# Altium schematic symbol library relay.SCHLIB: 425 symbols (part 2 of 3)
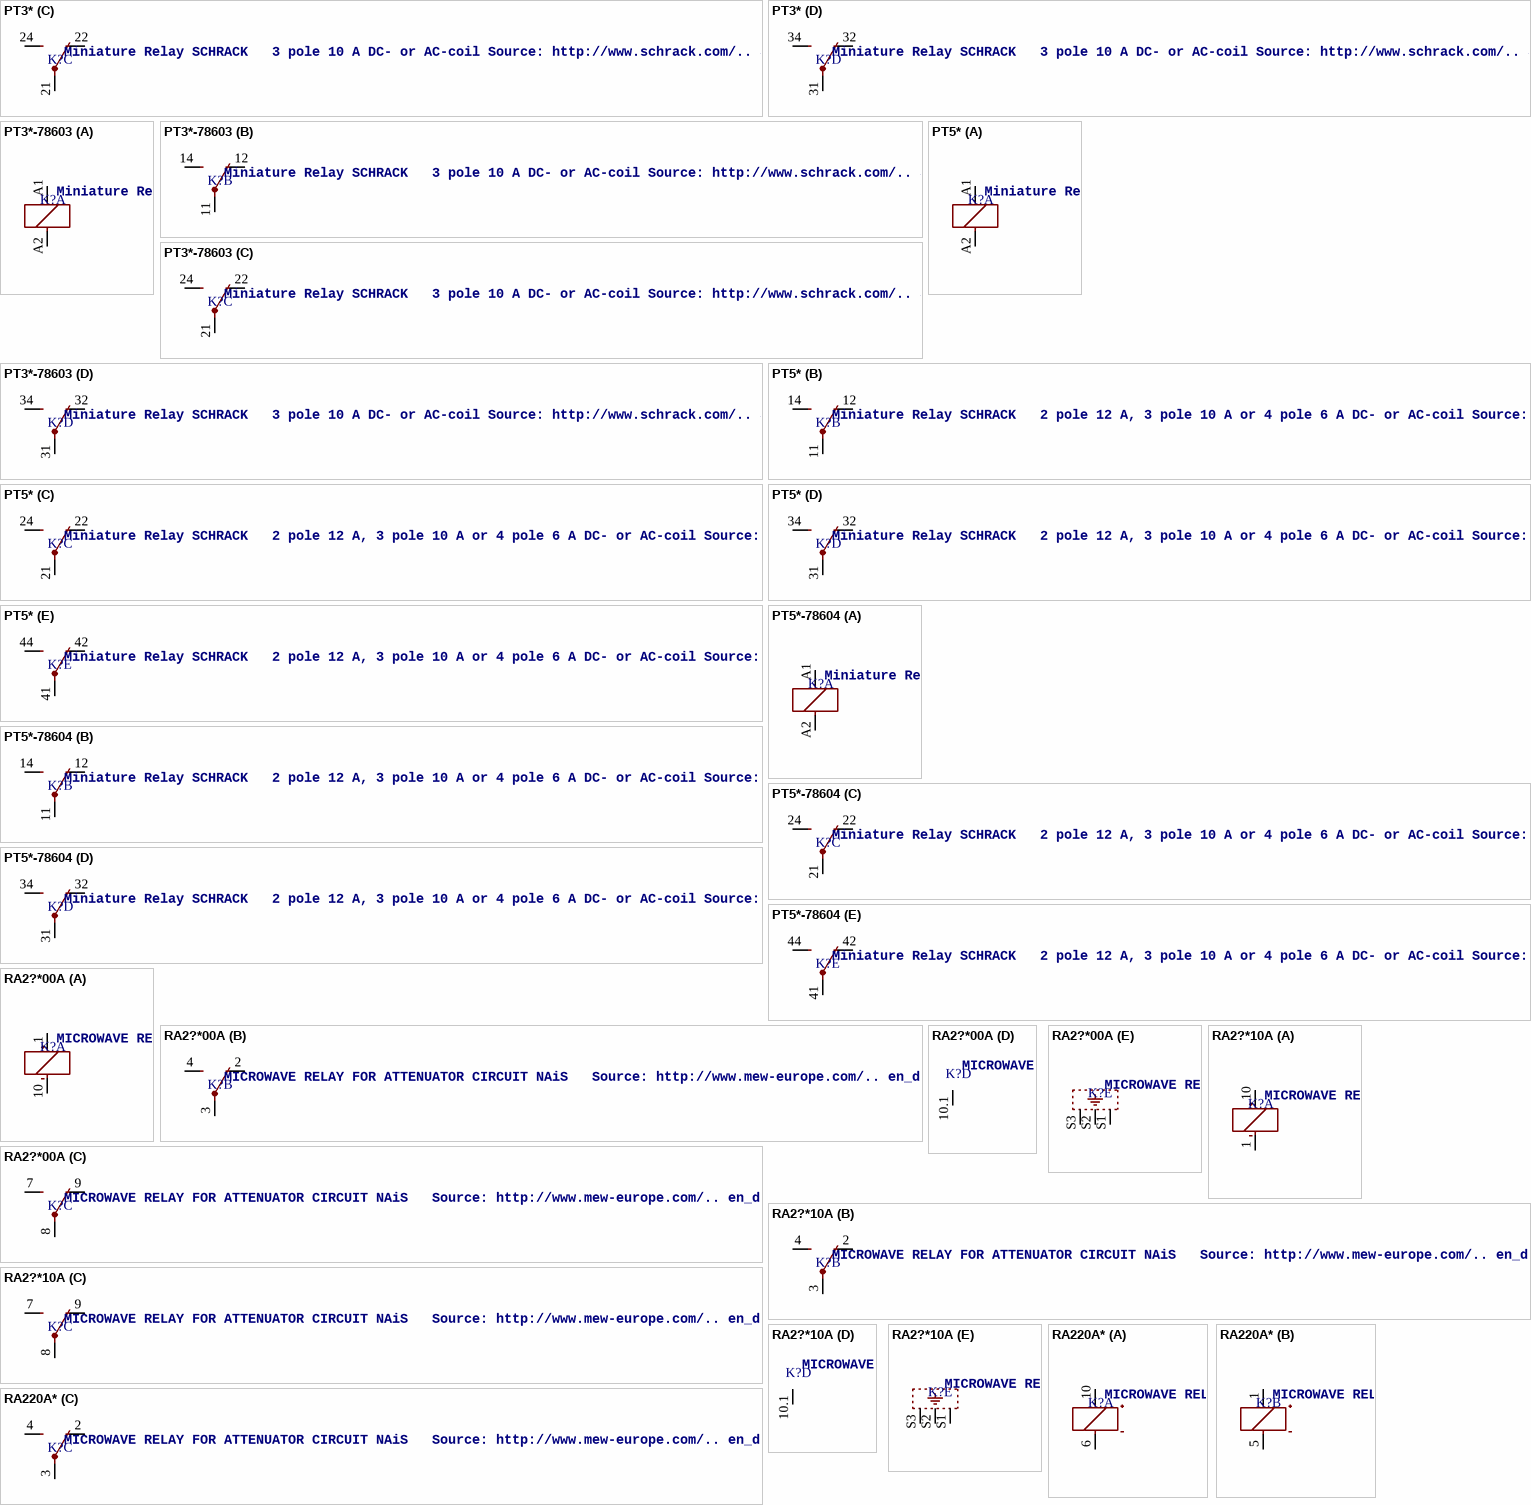
[diagram p39: symbols PT3* to RA220A*]

## PT5*
designator K?, comment Miniature Relay SCHRACK   2 pole 12 A, 3 pole 10 A or 4 pole 6 A DC- or AC-coil Source: http://www.schrack.com/.. 5823.pdf Socked 78604 Source: http://www.schrack.com/.. 5836.pdf
MPN: PT571524; MPN: PT571615; MPN: PT571730; MF: FARNELL; OC_FARNELL: unknown; OC_NEWARK: unknown; OC_FARNELL: 3072836; OC_NEWARK: 08J0830; OC_FARNELL: 3072990; OC_NEWARK: 85H0667; OC_FARNELL: 3073014; OC_NEWARK: 18J8266
footprint PT-4
part A pins: A1 1, A2 2
part B pins: 11 P, 12 O, 14 S
part C pins: 21 P, 22 O, 24 S
part D pins: 31 P, 32 O, 34 S
part E pins: 41 P, 42 O, 44 S

## PT5*-78604
designator K?, comment Miniature Relay SCHRACK   2 pole 12 A, 3 pole 10 A or 4 pole 6 A DC- or AC-coil Source: http://www.schrack.com/.. 5823.pdf Socked 78604 Source: http://www.schrack.com/.. 5836.pdf
OC_FARNELL: unknown; OC_NEWARK: unknown
footprint PT78604
part A pins: A1 1, A2 2
part B pins: 11 P, 12 O, 14 S
part C pins: 21 P, 22 O, 24 S
part D pins: 31 P, 32 O, 34 S
part E pins: 41 P, 42 O, 44 S

## RA2?*00A
designator K?, comment MICROWAVE RELAY FOR ATTENUATOR CIRCUIT NAiS   Source: http://www.mew-europe.com/.. en_ds_61308_0000.pdf
MPN: ARA200A03; OC_FARNELL: unknown; OC_NEWARK: 13P1235; OC_NEWARK: unknown
footprint RA
part A pins: 1 +, 10 -
part B pins: 2 O, 3 P, 4 S
part C pins: 7 S, 8 P, 9 O
part D pins: 10.1 -
part E pins: S1 SH@3, S2 SH@2, S3 SH@1

## RA2?*10A
designator K?, comment MICROWAVE RELAY FOR ATTENUATOR CIRCUIT NAiS   Source: http://www.mew-europe.com/.. en_ds_61308_0000.pdf
MPN: ARA210A05; MPN: ARA210A06; MPN: ARA210A12; MPN: ARA210A4H; MF: AROMAT/ MATSUSHITA; OC_FARNELL: unknown; OC_NEWARK: unknown; OC_NEWARK: 10C4091; OC_NEWARK: 10C4092; OC_NEWARK: 64K3073; OC_NEWARK: 64K3074
footprint RA-1COIL
part A pins: 1 -, 10 +
part B pins: 2 O, 3 P, 4 S
part C pins: 7 S, 8 P, 9 O
part D pins: 10.1 -
part E pins: S1 SH@3, S2 SH@2, S3 SH@1

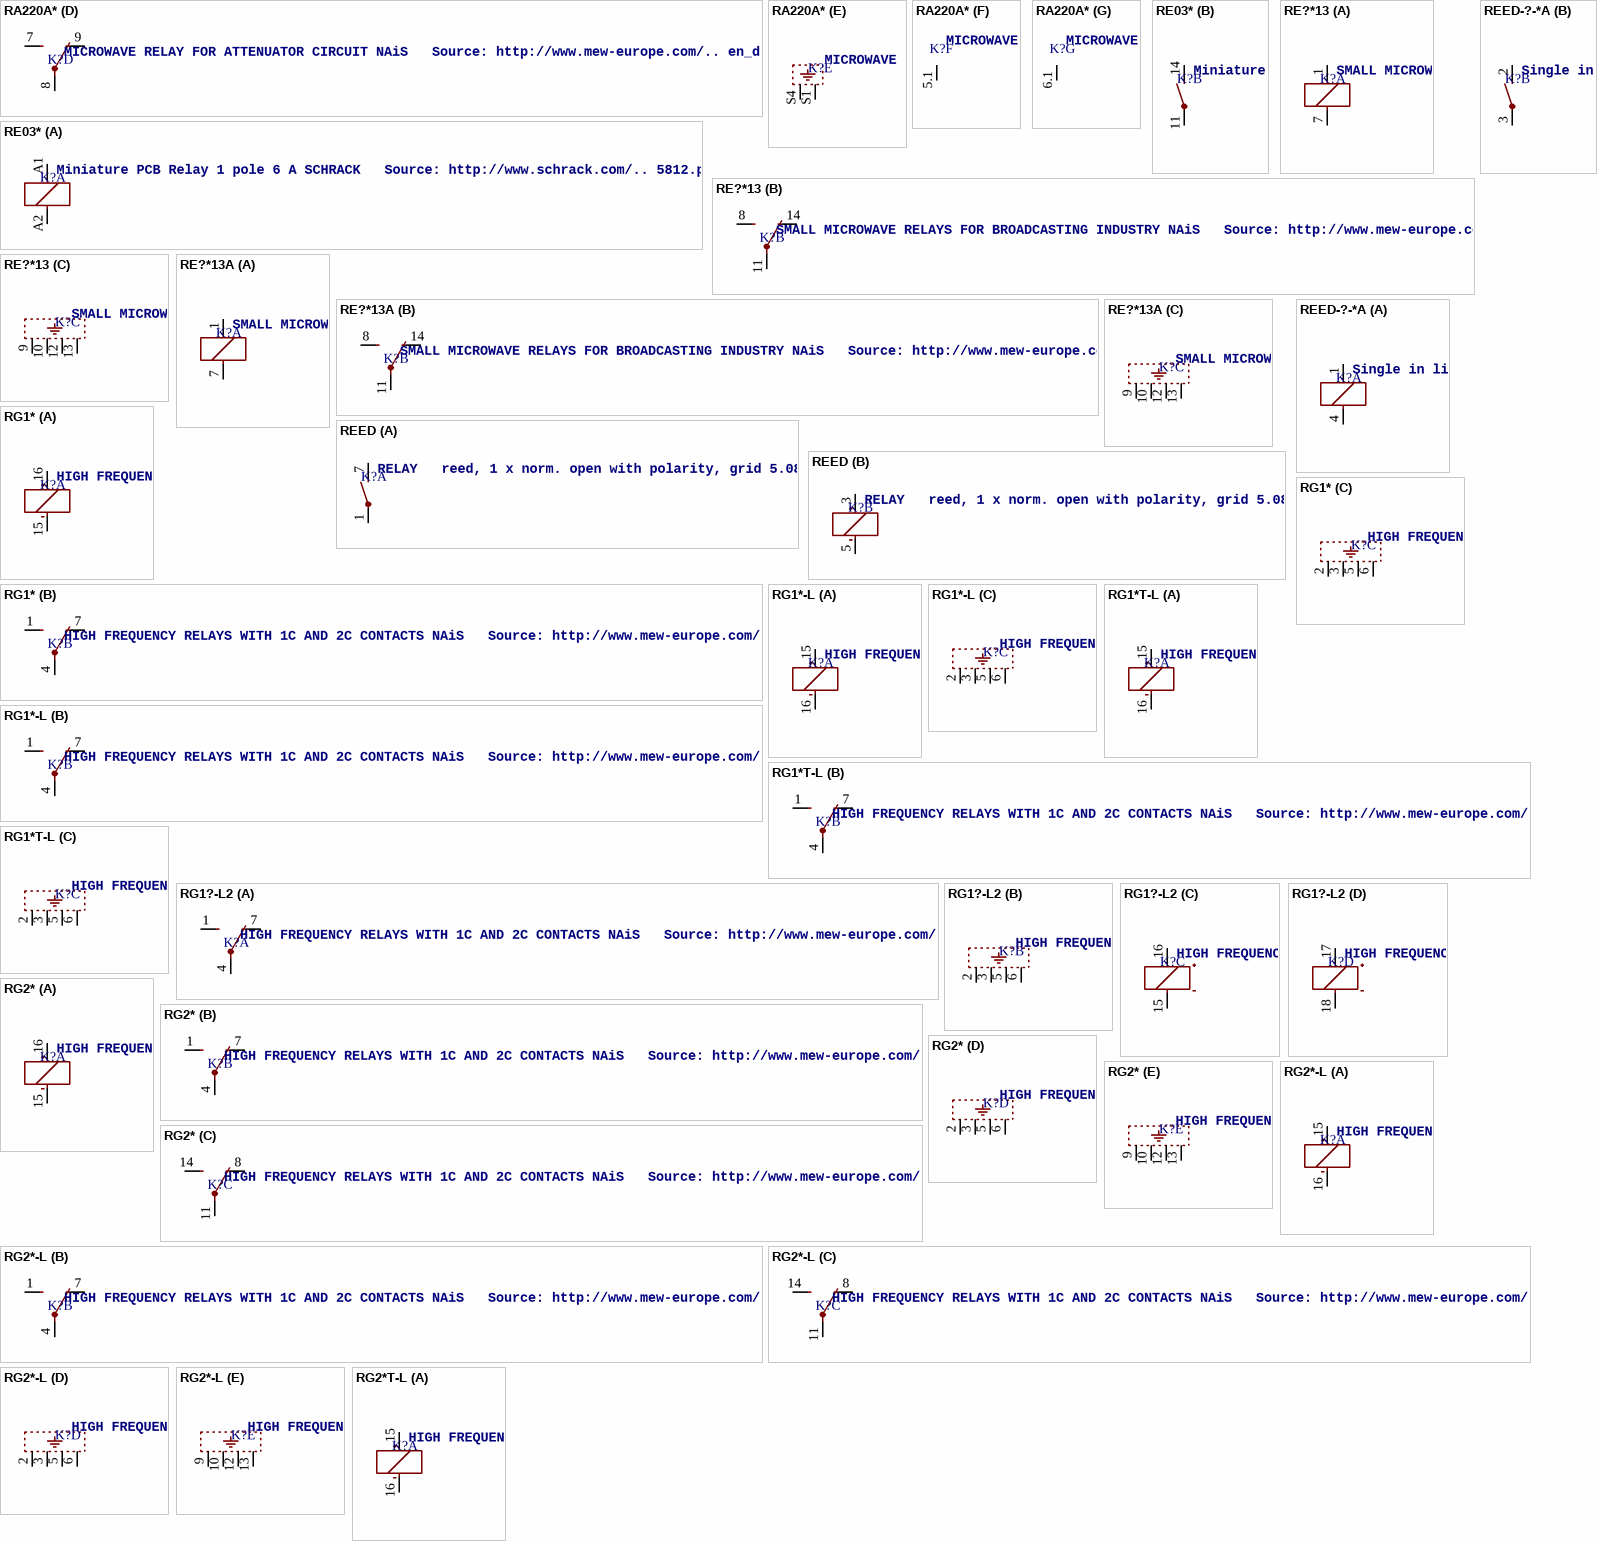
[diagram p19: symbols RA220A* to RG2*T-L]

## RA220A*
designator K?, comment MICROWAVE RELAY FOR ATTENUATOR CIRCUIT NAiS   Source: http://www.mew-europe.com/.. en_ds_61308_0000.pdf
MPN: ARA220A03Z; MPN: ARA220A05; MPN: ARA220A12Z; MPN: ARA220A4HZ; OC_FARNELL: unknown; OC_NEWARK: 12N3559; OC_NEWARK: 15P8679; OC_NEWARK: unknown; OC_NEWARK: 12N3560; OC_NEWARK: 12N3561
footprint RA-2COIL
part A pins: 6 -, 10 +
part B pins: 1 +, 5 -
part C pins: 2 O, 3 P, 4 S
part D pins: 7 S, 8 P, 9 O
part E pins: S1 SH@2, S4 SH@1
part F pins: 5.1 -
part G pins: 6.1 -

## RE03*
designator K?, comment Miniature PCB Relay 1 pole 6 A SCHRACK   Source: http://www.schrack.com/.. 5812.pdf
MPN: RE030005; MPN: RE030006; MPN: RE030012; MPN: RE030024; MPN: RE032005; MPN: RE032012; MPN: RE032024; MF: TYCO ELECTRONICS; OC_FARNELL: 515838; OC_NEWARK: 52F908; OC_FARNELL: unknown; OC_NEWARK: 92C1858; OC_FARNELL: 515840; OC_NEWARK: 17M1743; OC_FARNELL: 515851; OC_NEWARK: 52F910; OC_FARNELL: 1629023; OC_NEWARK: unknown; OC_NEWARK: 97K8812; OC_FARNELL: 9659684; OC_NEWARK: 97K8813; OC_FARNELL: 9659692; OC_NEWARK: 97K8814
footprint RE-SCHRACK
part A pins: A1 1, A2 2
part B pins: 11 P, 14 S

## RE?*13
designator K?, comment SMALL MICROWAVE RELAYS FOR BROADCASTING INDUSTRY NAiS   Source: http://www.mew-europe.com/.. en_ds_61310_0000.pdf
MPN: ARE1303; MPN: ARE1306; MPN: ARE1309; MPN: ARE1312; MPN: ARE1324; MPN: ARE134H; MF: AROMAT/ MATSUSHITA; OC_FARNELL: 1448347; OC_NEWARK: 64K3078; OC_FARNELL: unknown; OC_NEWARK: 11N2917; OC_NEWARK: 95M8248; OC_FARNELL: 3773000; OC_NEWARK: 13P1245; OC_NEWARK: 11N2919; OC_FARNELL: 3772998; OC_NEWARK: 13P1246
footprint RE
part A pins: 1, 7 2
part B pins: 8 S, 11 P, 14 O
part C pins: 9 SH@1, 10 SH@2, 12 SH@3, 13 SH@4

## RE?*13A
designator K?, comment SMALL MICROWAVE RELAYS FOR BROADCASTING INDUSTRY NAiS   Source: http://www.mew-europe.com/.. en_ds_61310_0000.pdf
MPN: ARE13A03; MPN: ARE13A06; MPN: ARE13A09; MPN: ARE13A12; MPN: ARE13A24; MPN: ARE13A4H; OC_FARNELL: unknown; OC_NEWARK: 71M0380; OC_NEWARK: 11N2902; OC_NEWARK: 11N2904; OC_FARNELL: 3773036; OC_NEWARK: 13P1241; OC_NEWARK: 11N2909; OC_FARNELL: 3773024; OC_NEWARK: 11N2913
footprint RE-SMD
part A pins: 1, 7 2
part B pins: 8 S, 11 P, 14 O
part C pins: 9 SH@1, 10 SH@2, 12 SH@3, 13 SH@4

## REED
designator K?, comment RELAY   reed, 1 x norm. open with polarity, grid 5.08
OC_FARNELL: unknown; OC_NEWARK: unknown
footprint REED
part A pins: 1 P, 7 S
part B pins: 3 +, 5 -

## REED-?-*A
designator K?, comment Single in line reed relay series A NAiS   Source: http://www.mew-europe.com/..  en_ds_61001_0000.pdf
OC_FARNELL: unknown; OC_NEWARK: unknown
footprint REED-SERIES-A
part A pins: 1, 4 2
part B pins: 2 S, 3 P

## RG1*
designator K?, comment HIGH FREQUENCY RELAYS WITH 1C AND 2C CONTACTS NAiS   Source: http://www.mew-europe.com/.. en_ds_61302_0000.pdf
OC_FARNELL: unknown; OC_NEWARK: unknown
footprint RG1
part A pins: 15 -, 16 +
part B pins: 1 S, 4 P, 7 O
part C pins: 2 SH@1, 3 SH@2, 5 SH@3, 6 SH@4

## RG1*-L
designator K?, comment HIGH FREQUENCY RELAYS WITH 1C AND 2C CONTACTS NAiS   Source: http://www.mew-europe.com/.. en_ds_61302_0000.pdf
OC_FARNELL: unknown; OC_NEWARK: unknown
footprint RG1
part A pins: 15 +, 16 -
part B pins: 1 S, 4 P, 7 O
part C pins: 2 SH@1, 3 SH@2, 5 SH@3, 6 SH@4

## RG1*T-L
designator K?, comment HIGH FREQUENCY RELAYS WITH 1C AND 2C CONTACTS NAiS   Source: http://www.mew-europe.com/.. en_ds_61302_0000.pdf
OC_FARNELL: unknown; OC_NEWARK: unknown
footprint RG1
part A pins: 15 +, 16 -
part B pins: 1 S, 4 P, 7 O
part C pins: 2 SH@1, 3 SH@2, 5 SH@3, 6 SH@4

## RG1?-L2
designator K?, comment HIGH FREQUENCY RELAYS WITH 1C AND 2C CONTACTS NAiS   Source: http://www.mew-europe.com/.. en_ds_61302_0000.pdf
OC_FARNELL: unknown; OC_NEWARK: unknown
footprint RG1
part A pins: 1 S, 4 P, 7 O
part B pins: 2 SH@1, 3 SH@2, 5 SH@3, 6 SH@4
part C pins: 15 -, 16 +
part D pins: 17 +, 18 -

## RG2*
designator K?, comment HIGH FREQUENCY RELAYS WITH 1C AND 2C CONTACTS NAiS   Source: http://www.mew-europe.com/.. en_ds_61302_0000.pdf
OC_FARNELL: unknown; OC_NEWARK: unknown
footprint RG2
part A pins: 15 -, 16 +
part B pins: 1 S, 4 P, 7 O
part C pins: 8 O, 11 P, 14 S
part D pins: 2 SH@1, 3 SH@2, 5 SH@3, 6 SH@4
part E pins: 9 SH@1, 10 SH@2, 12 SH@3, 13 SH@4

## RG2*-L
designator K?, comment HIGH FREQUENCY RELAYS WITH 1C AND 2C CONTACTS NAiS   Source: http://www.mew-europe.com/.. en_ds_61302_0000.pdf
OC_FARNELL: unknown; OC_NEWARK: unknown
footprint RG2
part A pins: 15 +, 16 -
part B pins: 1 S, 4 P, 7 O
part C pins: 8 O, 11 P, 14 S
part D pins: 2 SH@1, 3 SH@2, 5 SH@3, 6 SH@4
part E pins: 9 SH@1, 10 SH@2, 12 SH@3, 13 SH@4

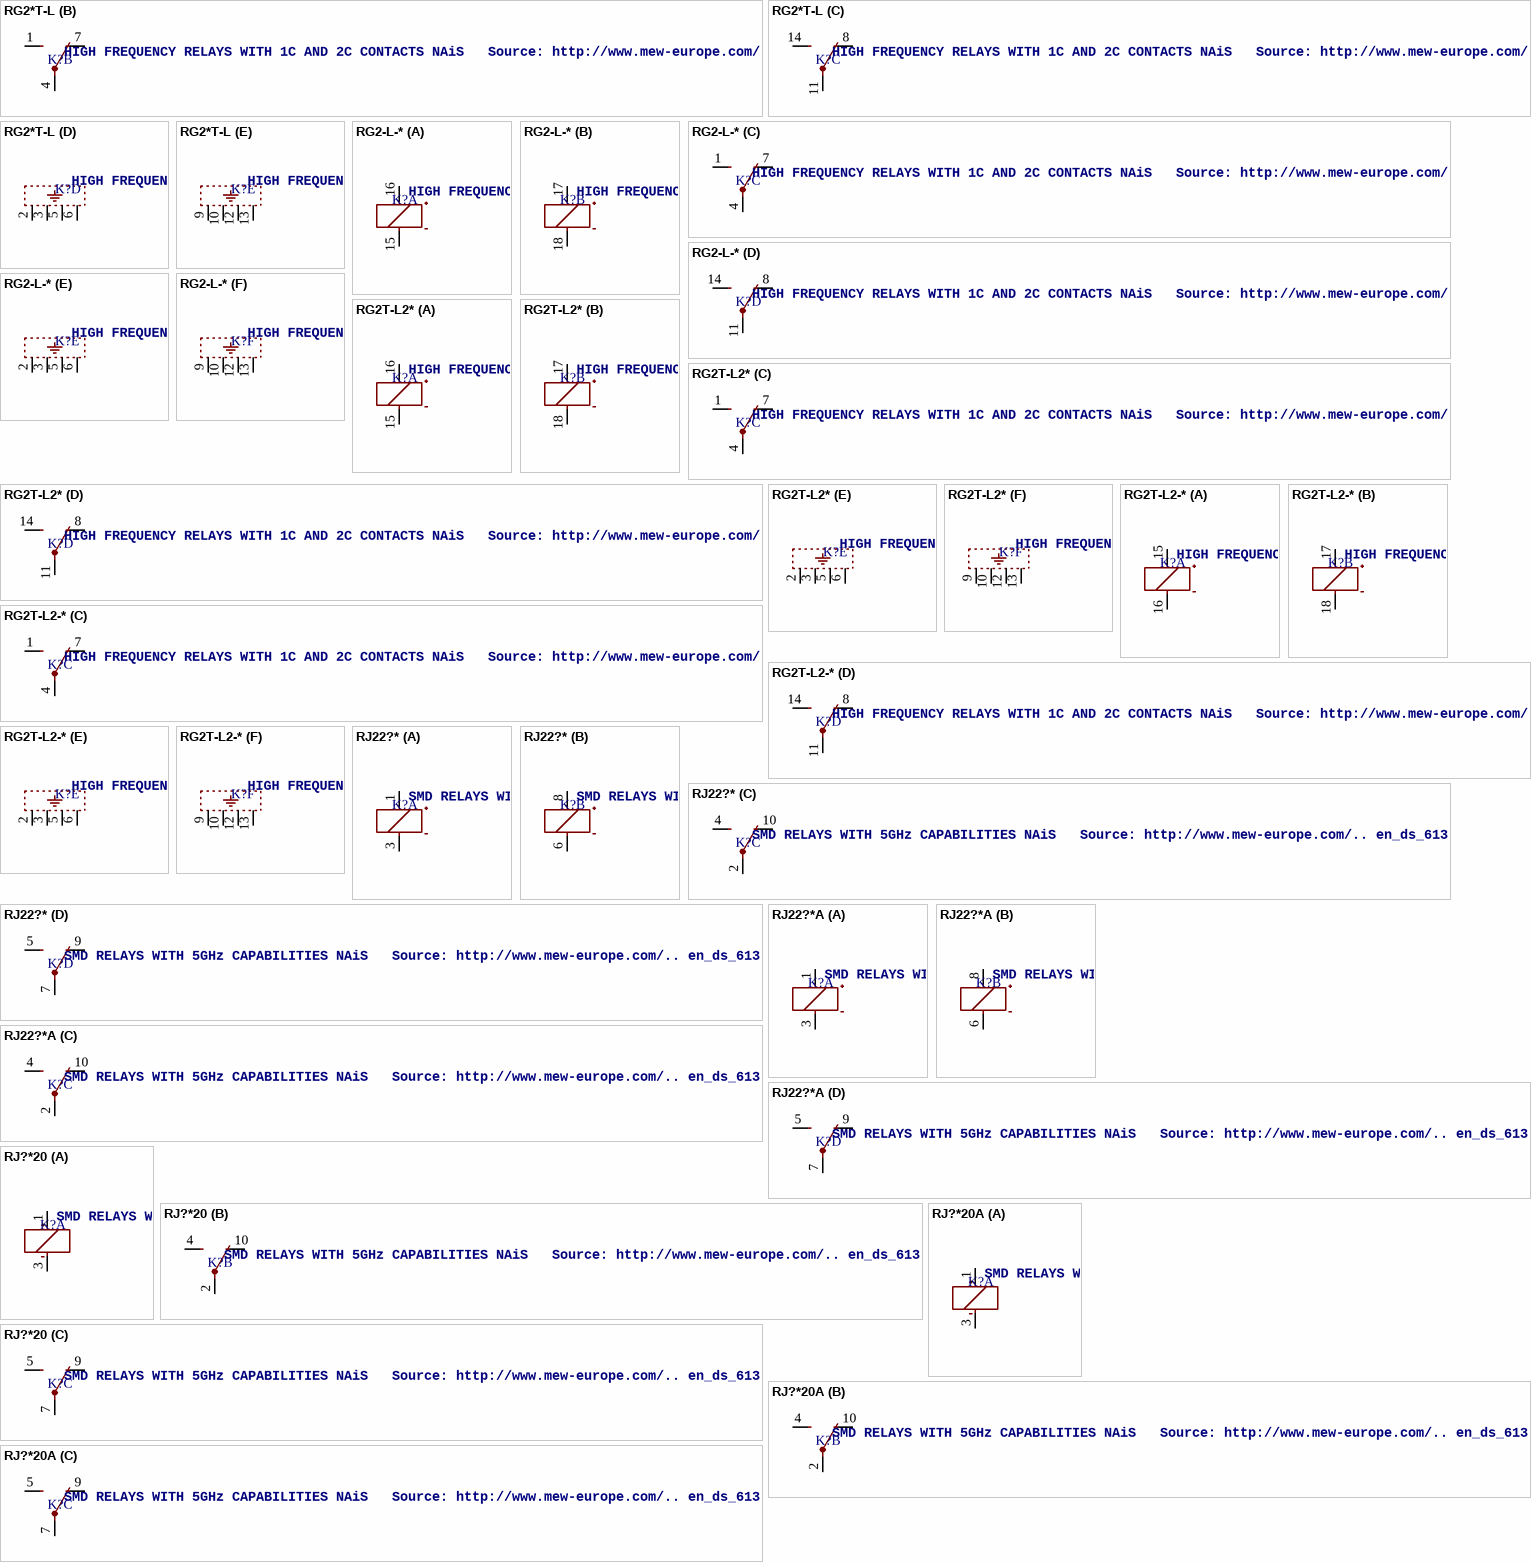
[diagram p20: symbols RG2*T-L to RJ?*20A]

## RG2*T-L
designator K?, comment HIGH FREQUENCY RELAYS WITH 1C AND 2C CONTACTS NAiS   Source: http://www.mew-europe.com/.. en_ds_61302_0000.pdf
OC_FARNELL: unknown; OC_NEWARK: unknown
footprint RG2
part A pins: 15 +, 16 -
part B pins: 1 S, 4 P, 7 O
part C pins: 8 O, 11 P, 14 S
part D pins: 2 SH@1, 3 SH@2, 5 SH@3, 6 SH@4
part E pins: 9 SH@1, 10 SH@2, 12 SH@3, 13 SH@4

## RG2-L-*
designator K?, comment HIGH FREQUENCY RELAYS WITH 1C AND 2C CONTACTS NAiS   Source: http://www.mew-europe.com/.. en_ds_61302_0000.pdf
OC_FARNELL: unknown; OC_NEWARK: unknown
footprint RG2
part A pins: 15 -, 16 +
part B pins: 17 +, 18 -
part C pins: 1 S, 4 P, 7 O
part D pins: 8 O, 11 P, 14 S
part E pins: 2 SH@1, 3 SH@2, 5 SH@3, 6 SH@4
part F pins: 9 SH@1, 10 SH@2, 12 SH@3, 13 SH@4

## RG2T-L2*
designator K?, comment HIGH FREQUENCY RELAYS WITH 1C AND 2C CONTACTS NAiS   Source: http://www.mew-europe.com/.. en_ds_61302_0000.pdf
OC_FARNELL: unknown; OC_NEWARK: unknown
footprint RG2
part A pins: 15 -, 16 +
part B pins: 17 +, 18 -
part C pins: 1 S, 4 P, 7 O
part D pins: 8 O, 11 P, 14 S
part E pins: 2 SH@1, 3 SH@2, 5 SH@3, 6 SH@4
part F pins: 9 SH@1, 10 SH@2, 12 SH@3, 13 SH@4

## RG2T-L2-*
designator K?, comment HIGH FREQUENCY RELAYS WITH 1C AND 2C CONTACTS NAiS   Source: http://www.mew-europe.com/.. en_ds_61302_0000.pdf
OC_FARNELL: unknown; OC_NEWARK: unknown
footprint RG2
part A pins: 15 +, 16 -
part B pins: 17 +, 18 -
part C pins: 1 S, 4 P, 7 O
part D pins: 8 O, 11 P, 14 S
part E pins: 2 SH@1, 3 SH@2, 5 SH@3, 6 SH@4
part F pins: 9 SH@1, 10 SH@2, 12 SH@3, 13 SH@4

## RJ22?*
designator K?, comment SMD RELAYS WITH 5GHz CAPABILITIES NAiS   Source: http://www.mew-europe.com/.. en_ds_61313_0000.pdf
MPN: ARJ2203; MPN: ARJ2212; MPN: ARJ2224; MPN: ARJ224H; OC_FARNELL: unknown; OC_NEWARK: 11N2935; OC_NEWARK: 11N2936; OC_NEWARK: 11N2937; OC_NEWARK: 11N2938
footprint RJ
part A pins: 1 +, 3 -
part B pins: 6 -, 8 +
part C pins: 2 P, 4 S, 10 O
part D pins: 5 S, 7 P, 9 O

## RJ22?*A
designator K?, comment SMD RELAYS WITH 5GHz CAPABILITIES NAiS   Source: http://www.mew-europe.com/.. en_ds_61313_0000.pdf
MPN: ARJ22A03; MPN: ARJ22A12; MPN: ARJ22A24; MPN: ARJ22A4H; OC_FARNELL: unknown; OC_NEWARK: 11N2929; OC_FARNELL: 9008446; OC_NEWARK: 13P1249; OC_NEWARK: 11N2932; OC_NEWARK: 13P1250
footprint RJ-SMD
part A pins: 1 +, 3 -
part B pins: 6 -, 8 +
part C pins: 2 P, 4 S, 10 O
part D pins: 5 S, 7 P, 9 O

## RJ?*20
designator K?, comment SMD RELAYS WITH 5GHz CAPABILITIES NAiS   Source: http://www.mew-europe.com/.. en_ds_61313_0000.pdf
MPN: ARJ2003; MPN: ARJ2012; MPN: ARJ2024; MPN: ARJ204H; MF: AROMAT/ MATSUSHITA; OC_FARNELL: unknown; OC_NEWARK: 11N2927; OC_NEWARK: 81C8602; OC_NEWARK: 11N2928; OC_NEWARK: 63H2424
footprint RJ
part A pins: 1 +, 3 -
part B pins: 2 P, 4 S, 10 O
part C pins: 5 S, 7 P, 9 O

## RJ?*20A
designator K?, comment SMD RELAYS WITH 5GHz CAPABILITIES NAiS   Source: http://www.mew-europe.com/.. en_ds_61313_0000.pdf
MPN: ARJ20A03; MPN: ARJ20A12; MPN: ARJ20A24; MPN: ARJ20A4H; OC_FARNELL: unknown; OC_NEWARK: 11N2921; OC_FARNELL: 8928207; OC_NEWARK: 13P1247; OC_NEWARK: 11N2924; OC_NEWARK: 13P1248
footprint RJ-SMD
part A pins: 1 +, 3 -
part B pins: 2 P, 4 S, 10 O
part C pins: 5 S, 7 P, 9 O

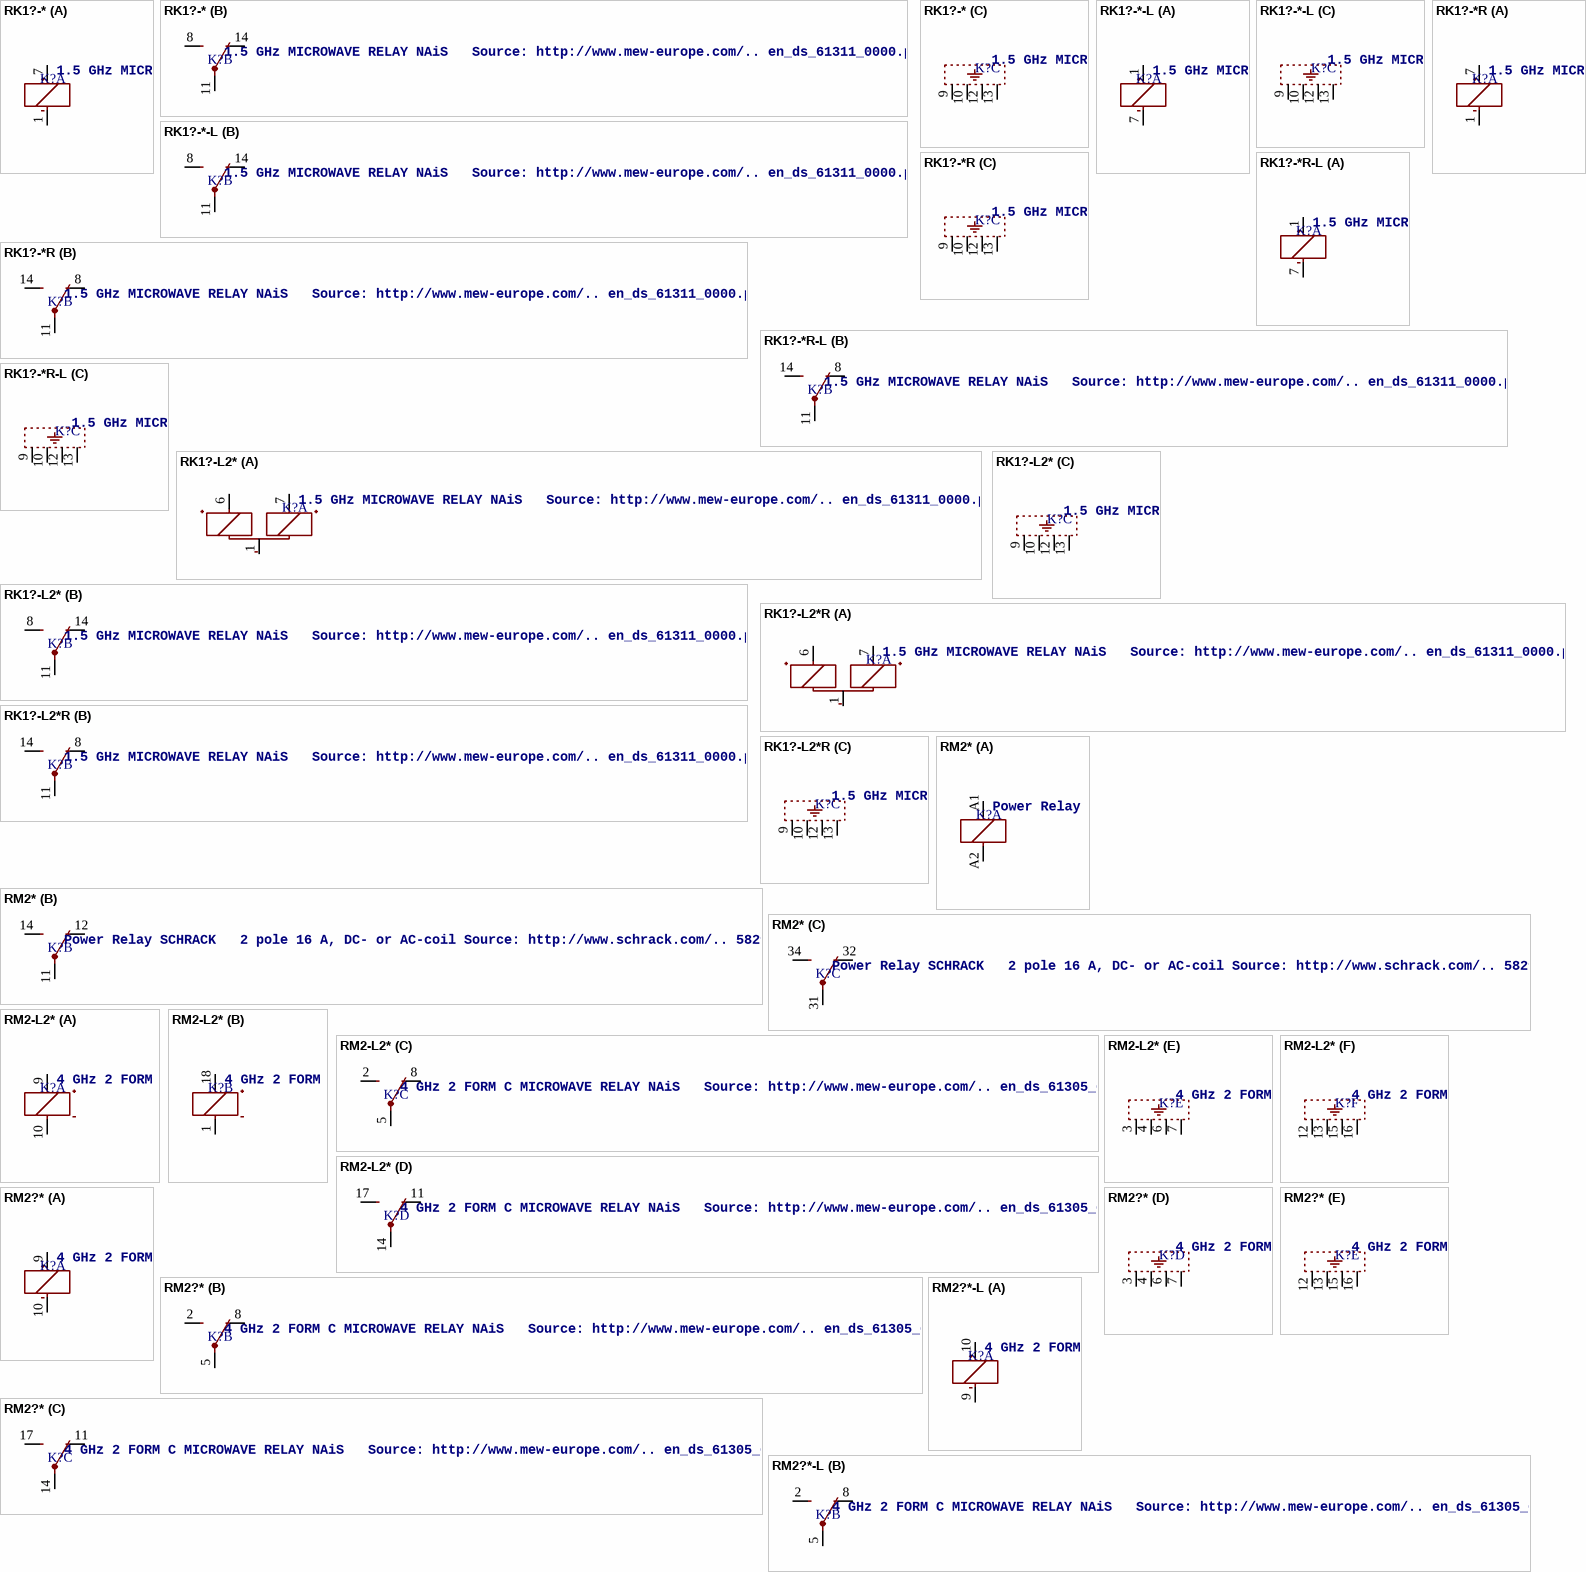
[diagram p21: symbols RK1?-* to RM2?*-L]

## RK1?-*
designator K?, comment 1.5 GHz MICROWAVE RELAY NAiS   Source: http://www.mew-europe.com/.. en_ds_61311_0000.pdf
MPN: RK1-12V; MPN: RK1-24V; MPN: RK1-4.5V; MPN: RK1-5V; MPN: RK1-6V; MF: AROMAT/ MATSUSHITA; OC_FARNELL: unknown; OC_NEWARK: 13P6876; OC_NEWARK: 13P6877; OC_NEWARK: unknown; OC_NEWARK: 13P6878; OC_NEWARK: 13P6879; OC_NEWARK: 10C9196
footprint RK1A
part A pins: 1 -, 7 +
part B pins: 8 S, 11 P, 14 O
part C pins: 9 SH@1, 10 SH@2, 12 SH@3, 13 SH@4

## RK1?-*-L
designator K?, comment 1.5 GHz MICROWAVE RELAY NAiS   Source: http://www.mew-europe.com/.. en_ds_61311_0000.pdf
MPN: RK1-L-4.5V; MPN: RK1-L-5V; MF: AROMAT/ MATSUSHITA; OC_FARNELL: unknown; OC_NEWARK: unknown; OC_NEWARK: 11N5893; OC_NEWARK: 10C9186
footprint RK1A
part A pins: 1 +, 7 -
part B pins: 8 S, 11 P, 14 O
part C pins: 9 SH@1, 10 SH@2, 12 SH@3, 13 SH@4

## RK1?-*R
designator K?, comment 1.5 GHz MICROWAVE RELAY NAiS   Source: http://www.mew-europe.com/.. en_ds_61311_0000.pdf
OC_FARNELL: unknown; OC_NEWARK: unknown
footprint RK1A
part A pins: 1 -, 7 +
part B pins: 8 O, 11 P, 14 S
part C pins: 9 SH@1, 10 SH@2, 12 SH@3, 13 SH@4

## RK1?-*R-L
designator K?, comment 1.5 GHz MICROWAVE RELAY NAiS   Source: http://www.mew-europe.com/.. en_ds_61311_0000.pdf
OC_FARNELL: unknown; OC_NEWARK: unknown
footprint RK1A
part A pins: 1 +, 7 -
part B pins: 8 O, 11 P, 14 S
part C pins: 9 SH@1, 10 SH@2, 12 SH@3, 13 SH@4

## RK1?-L2*
designator K?, comment 1.5 GHz MICROWAVE RELAY NAiS   Source: http://www.mew-europe.com/.. en_ds_61311_0000.pdf
MPN: RK1-L2-12V; MF: AROMAT/ MATSUSHITA; OC_FARNELL: 1616207; OC_NEWARK: 10C9189
footprint RKL2
part A pins: 1 -, 6 S+, 7 R+
part B pins: 8 S, 11 P, 14 O
part C pins: 9 SH@1, 10 SH@2, 12 SH@3, 13 SH@4

## RK1?-L2*R
designator K?, comment 1.5 GHz MICROWAVE RELAY NAiS   Source: http://www.mew-europe.com/.. en_ds_61311_0000.pdf
OC_FARNELL: unknown; OC_NEWARK: unknown
footprint RKL2
part A pins: 1 -, 6 S+, 7 R+
part B pins: 8 O, 11 P, 14 S
part C pins: 9 SH@1, 10 SH@2, 12 SH@3, 13 SH@4

## RM2*
designator K?, comment Power Relay SCHRACK   2 pole 16 A, DC- or AC-coil Source: http://www.schrack.com/.. 5829.pdf
OC_FARNELL: unknown; OC_NEWARK: unknown
footprint RM-2
part A pins: A1 1, A2 2
part B pins: 11 P, 12 O, 14 S
part C pins: 31 P, 32 O, 34 S

## RM2-L2*
designator K?, comment 4 GHz 2 FORM C MICROWAVE RELAY NAiS   Source: http://www.mew-europe.com/.. en_ds_61305_0000.pdf
OC_FARNELL: unknown; OC_NEWARK: unknown
footprint RM2
part A pins: 9 +, 10 -
part B pins: 1 -, 18 +
part C pins: 2 S, 5 P, 8 O
part D pins: 11 O, 14 P, 17 S
part E pins: 3 SH@1, 4 SH@2, 6 SH@3, 7 SH@4
part F pins: 12 SH@1, 13 SH@2, 15 SH@3, 16 SH@4

## RM2?*
designator K?, comment 4 GHz 2 FORM C MICROWAVE RELAY NAiS   Source: http://www.mew-europe.com/.. en_ds_61305_0000.pdf
OC_FARNELL: unknown; OC_NEWARK: unknown
footprint RM
part A pins: 9 +, 10 -
part B pins: 2 S, 5 P, 8 O
part C pins: 11 O, 14 P, 17 S
part D pins: 3 SH@1, 4 SH@2, 6 SH@3, 7 SH@4
part E pins: 12 SH@1, 13 SH@2, 15 SH@3, 16 SH@4

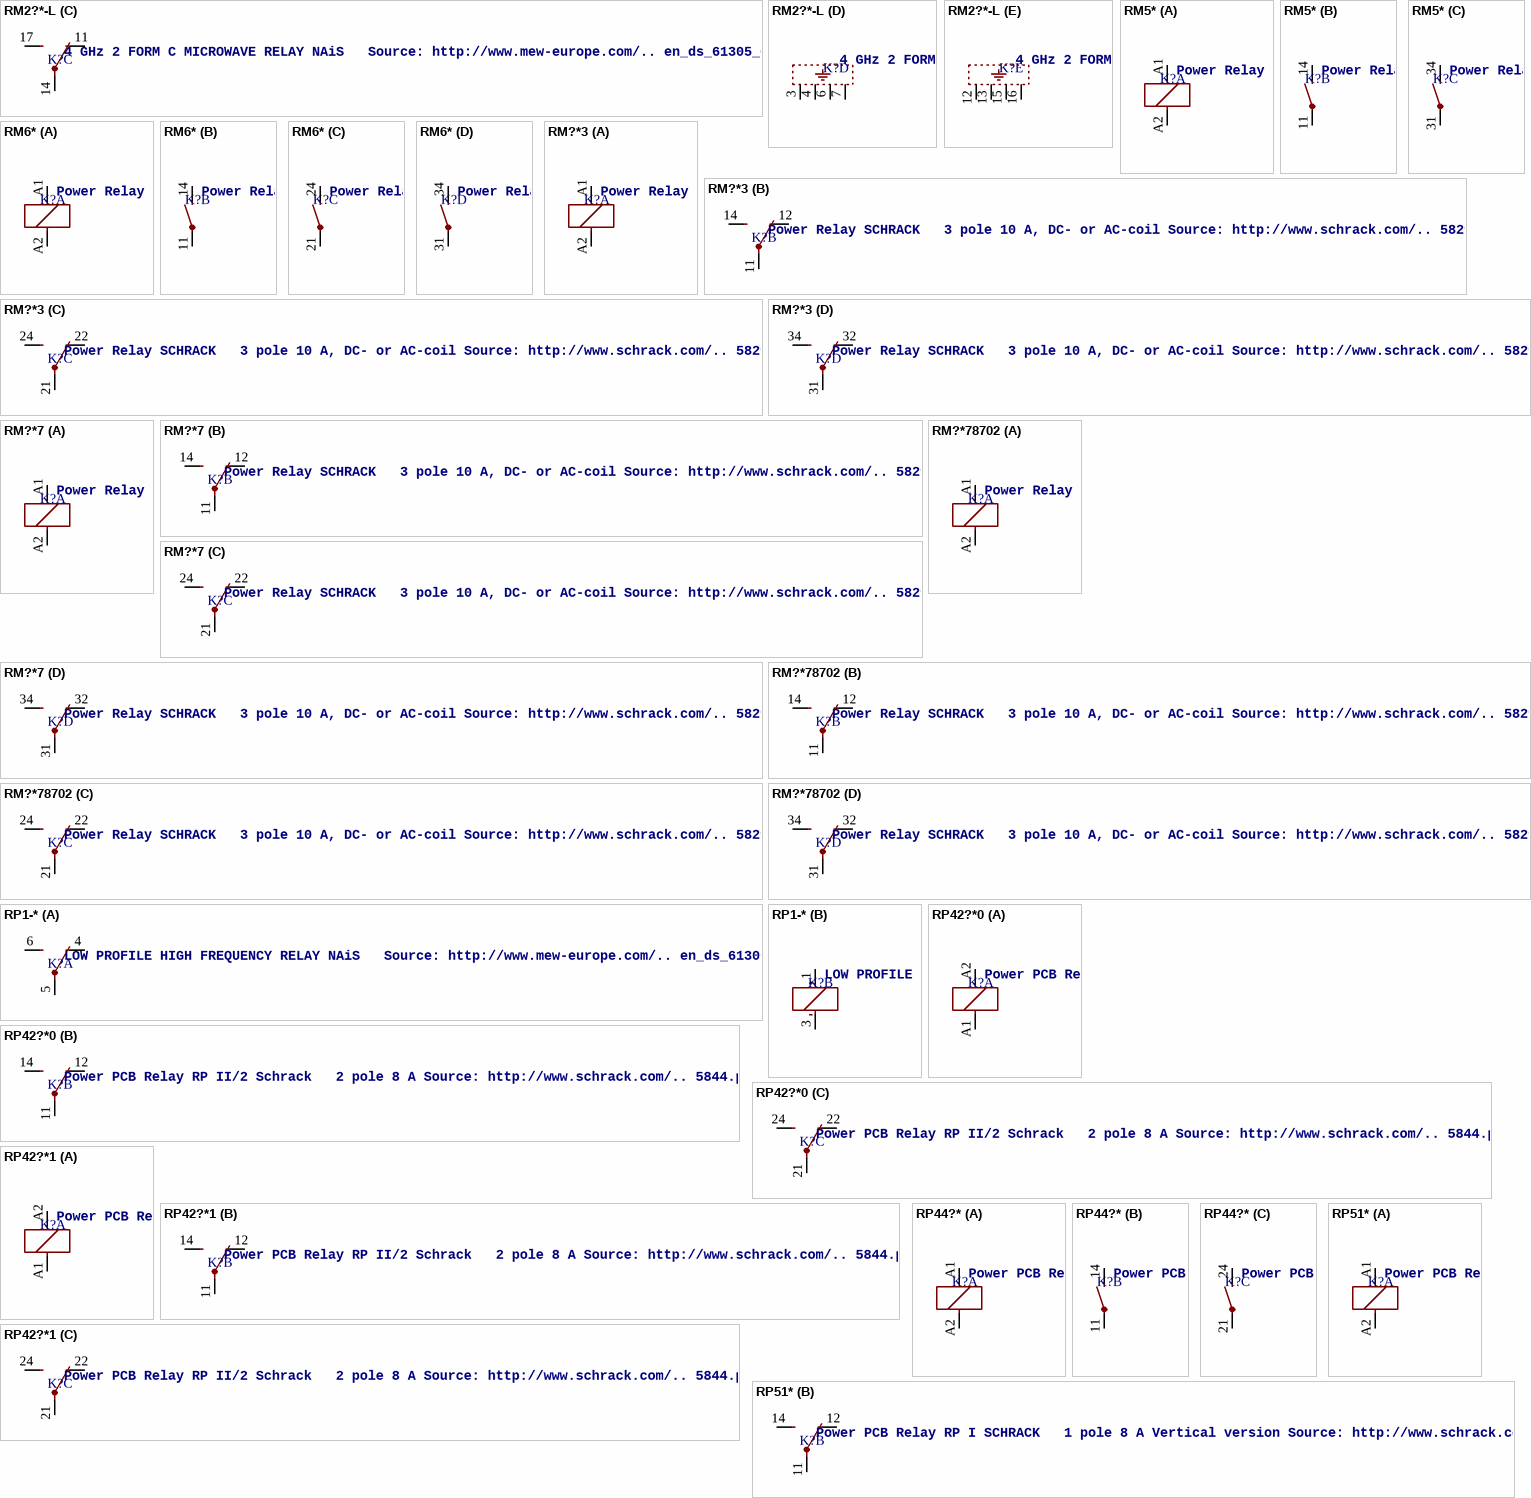
[diagram p22: symbols RM2?*-L to RP51*]

## RM2?*-L
designator K?, comment 4 GHz 2 FORM C MICROWAVE RELAY NAiS   Source: http://www.mew-europe.com/.. en_ds_61305_0000.pdf
OC_FARNELL: unknown; OC_NEWARK: unknown
footprint RM
part A pins: 9 -, 10 +
part B pins: 2 S, 5 P, 8 O
part C pins: 11 O, 14 P, 17 S
part D pins: 3 SH@1, 4 SH@2, 6 SH@3, 7 SH@4
part E pins: 12 SH@1, 13 SH@2, 15 SH@3, 16 SH@4

## RM5*
designator K?, comment Power Relay SCHRACK   2 pole 16 A, DC- or AC-coil Source: http://www.schrack.com/.. 5832.pdf
OC_FARNELL: unknown; OC_NEWARK: unknown
footprint RM-6
part A pins: A1 1, A2 2
part B pins: 11 P, 14 S
part C pins: 31 P, 34 S

## RM6*
designator K?, comment Power Relay SCHRACK   3 pole 10 A, DC- or AC-coil Source: http://www.schrack.com/.. 5832.pdf
MPN: RM607524; MPN: RM607730; OC_FARNELL: unknown; OC_NEWARK: unknown; OC_NEWARK: 48M7685; OC_NEWARK: 03M2867
footprint RM-5
part A pins: A1 1, A2 2
part B pins: 11 P, 14 S
part C pins: 21 P, 24 S
part D pins: 31 P, 34 S

## RM?*3
designator K?, comment Power Relay SCHRACK   3 pole 10 A, DC- or AC-coil Source: http://www.schrack.com/.. 5829.pdf Socket with PCB terminals Source: http://www.schrack.com/.. 5841.pdf
OC_FARNELL: unknown; OC_NEWARK: unknown
footprint RM-2/3/7
part A pins: A1 1, A2 2
part B pins: 11 P, 12 O, 14 S
part C pins: 21 P, 22 O, 24 S
part D pins: 31 P, 32 O, 34 S

## RM?*7
designator K?, comment Power Relay SCHRACK   3 pole 10 A, DC- or AC-coil Source: http://www.schrack.com/.. 5829.pdf Socket with PCB terminals Source: http://www.schrack.com/.. 5841.pdf
OC_FARNELL: unknown; OC_NEWARK: unknown
footprint RM-2/3/7
part A pins: A1 1, A2 2
part B pins: 11 P, 12 O, 14 S
part C pins: 21 P, 22 O, 24 S
part D pins: 31 P, 32 O, 34 S

## RM?*78702
designator K?, comment Power Relay SCHRACK   3 pole 10 A, DC- or AC-coil Source: http://www.schrack.com/.. 5829.pdf Socket with PCB terminals Source: http://www.schrack.com/.. 5841.pdf
MPN: RM78702; MF: TYCO ELECTRONICS; OC_FARNELL: 1652632; OC_NEWARK: 36K3468
footprint RM78702
part A pins: A1 1, A2 2
part B pins: 11 P, 12 O, 14 S
part C pins: 21 P, 22 O, 24 S
part D pins: 31 P, 32 O, 34 S

## RP1-*
designator K?, comment LOW PROFILE HIGH FREQUENCY RELAY NAiS   Source: http://www.mew-europe.com/.. en_ds_61306_0000.pdf
MPN: RP1-12V; MPN: RP1-24V; MPN: RP1-5V; MF: AROMAT/ MATSUSHITA; OC_FARNELL: unknown; OC_NEWARK: unknown; OC_NEWARK: 92B3783; OC_NEWARK: 10C9248; OC_NEWARK: 64K3170
footprint RP
part A pins: 4 O, 5 P, 6 S
part B pins: 1 +, 3 -

## RP42?*0
designator K?, comment Power PCB Relay RP II/2 Schrack   2 pole 8 A Source: http://www.schrack.com/.. 5844.pdf
MPN: RP420005; MPN: RP420006; MPN: RP420012; MPN: RP420024; MPN: RP420048; MPN: RP420060; MPN: RP420110; MF: TYCO ELECTRONICS; OC_FARNELL: unknown; OC_NEWARK: 48M7798; OC_NEWARK: 48M7799; OC_FARNELL: 3103330; OC_NEWARK: 90B4410; OC_FARNELL: 1703720; OC_NEWARK: 51B969; OC_NEWARK: 92C3381; OC_NEWARK: 48M7803; OC_NEWARK: 08H3601
footprint RP420
part A pins: A1 2, A2 1
part B pins: 11 P, 12 O, 14 S
part C pins: 21 P, 22 O, 24 S

## RP42?*1
designator K?, comment Power PCB Relay RP II/2 Schrack   2 pole 8 A Source: http://www.schrack.com/.. 5844.pdf
MPN: 6-1393234-4; MPN: 6-1393234-5; MPN: RP421012; MPN: RP421024; MPN: RP421048; MPN: RP421060; MPN: RP421110; MF: TYCO ELECTRONICS; OC_FARNELL: unknown; OC_NEWARK: 16H0760; OC_NEWARK: 16H0761; OC_NEWARK: 90B5481; OC_FARNELL: 1608388; OC_NEWARK: 01C0518; OC_NEWARK: 08H3604; OC_NEWARK: 84H0645; OC_NEWARK: 39C2625
footprint RP420
part A pins: A1 2, A2 1
part B pins: 11 P, 12 O, 14 S
part C pins: 21 P, 22 O, 24 S

## RP44?*
designator K?, comment Power PCB Relay RP II/2 Schrack   2 pole 8 A Source: http://www.schrack.com/.. 5844.pdf
MPN: RP440012; MPN: RP440024; MPN: RP441012; MPN: RP441024; MF: TYCO ELECTRONICS; OC_FARNELL: unknown; OC_NEWARK: unknown; OC_NEWARK: 07H9451; OC_NEWARK: 48M7816; OC_NEWARK: 09H1465; OC_NEWARK: 48M7817
footprint RP440
part A pins: A1 1, A2 2
part B pins: 11 P, 14 S
part C pins: 21 P, 24 S

## RP51*
designator K?, comment Power PCB Relay RP I SCHRACK   1 pole 8 A Vertical version Source: http://www.schrack.com/.. 5845.pdf
OC_FARNELL: unknown; OC_NEWARK: unknown
footprint RP51
part A pins: A1 1, A2 2
part B pins: 11 P, 12 O, 14 S
